# Altium footprint library CD's_LIB_2018.PcbLib: 155 footprints (part 6 of 10)
Each footprint in its own frame and in the unit in brackets; x right, y up, seen from the top. Pads: shape width x height; smd on the part's side, far side on the other; paste and mask are expansions set on the pad; w line width, h text height; cw(c..) or ccw(c..) is an arc to the next point about the centre after c.
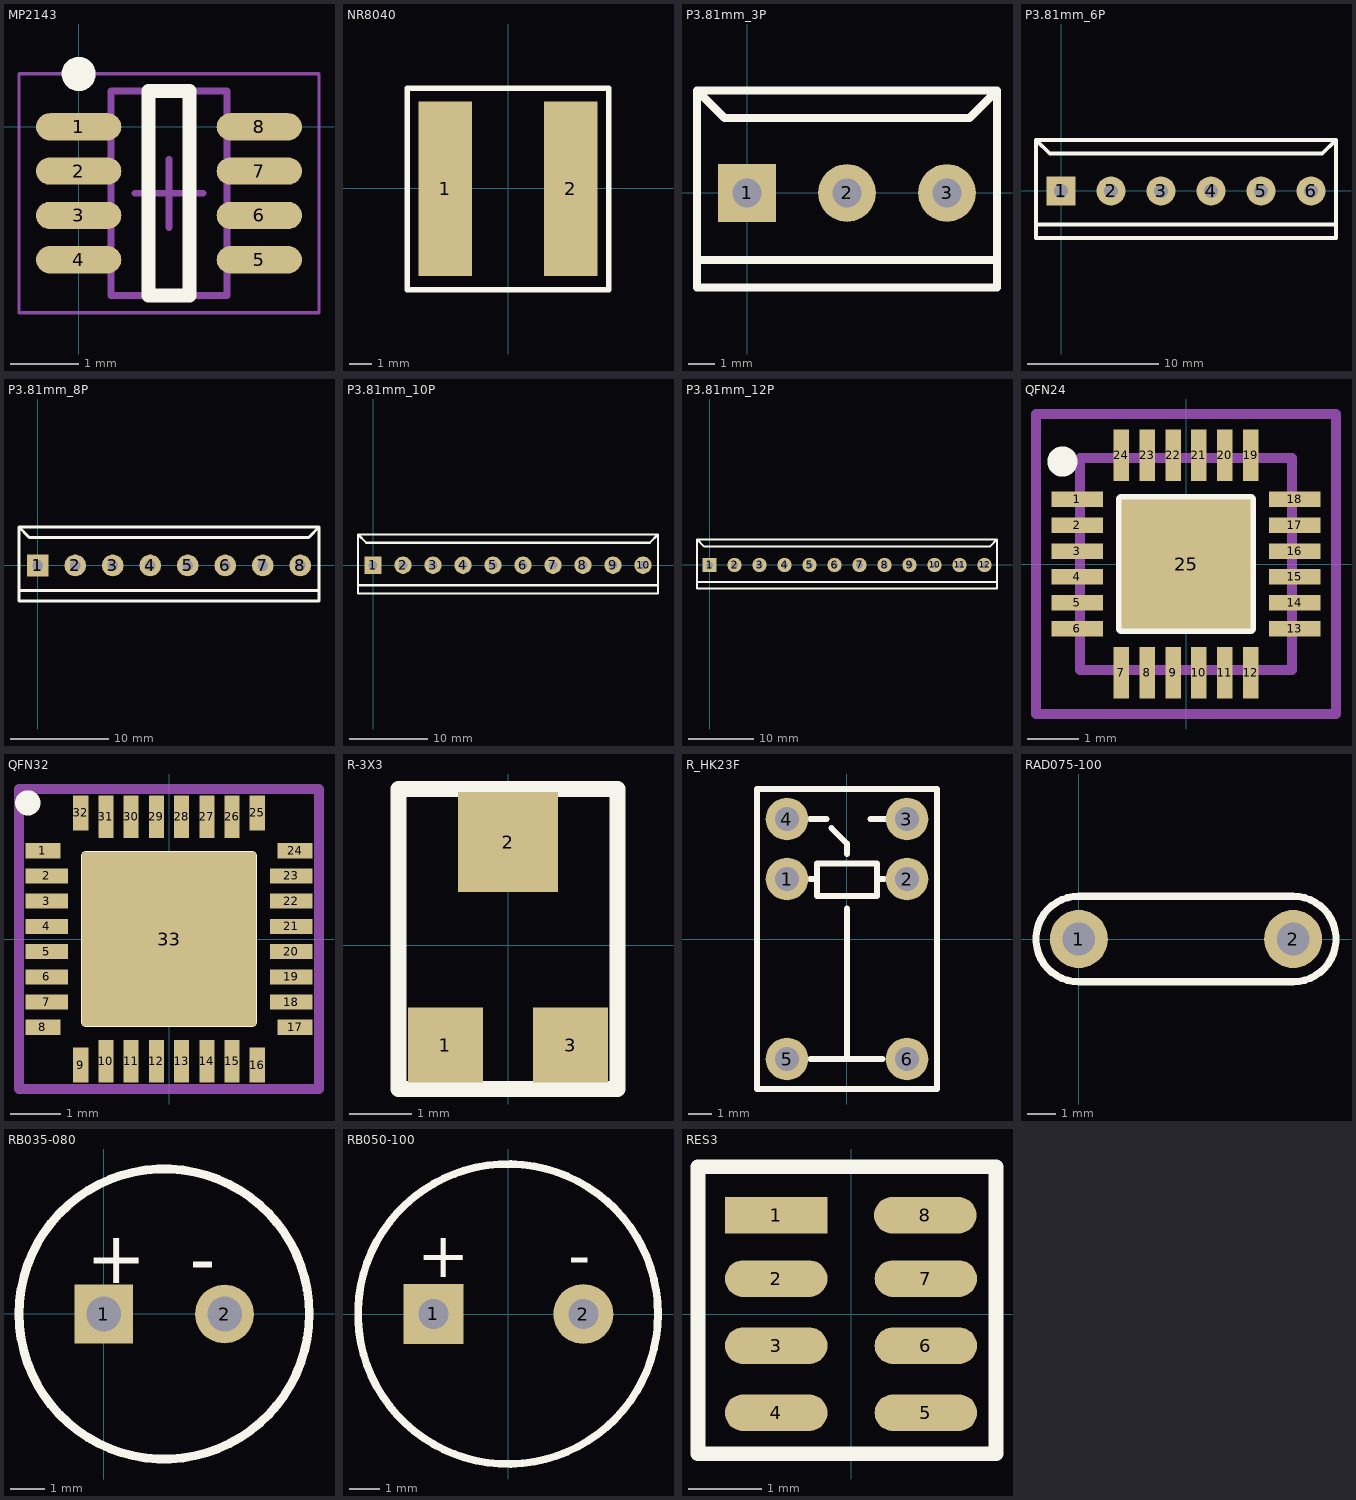
[diagram p5: the footprints below, top view; thin cyan lines are the x and y axes]

## MP2143 [mm] "TSOT23-8"
height 1
pads (8):
  oval 1.25x0.4 smd: 1(0,0) 2(0,-0.65) 3(0,-1.3) 4(0,-1.95) 5(2.65,-1.95) 6(2.65,-1.3) 7(2.65,-0.65) 8(2.65,0)
Top Overlay:
  circle w0.25: c0,0.775 r0.125
  lines w0.2: 1.025,-2.475 1.025,0.525 1.625,0.525 1.625,-2.475 1.025,-2.475
Mechanical 13:
  lines w0.1: 0.475,-2.475 0.475,0.525 2.175,0.525 2.175,-2.475 0.475,-2.475
Mechanical 15:
  lines w0.05: -0.875,-2.725 -0.875,0.775 3.525,0.775 3.525,-2.725 -0.875,-2.725
  lines w0.1: 0.825,-0.975 1.825,-0.975 ; 1.325,-1.475 1.325,-0.475
3D body: height 1, standoff 1, extent 0.475,-2.475 2.175,0.525

## NR8040 [mm]
pads (2):
  rect 2.4x7.8 smd: 1(-2.806,-0.021) 2(2.794,-0.021)
Top Overlay:
  lines w0.254: -4.502,-4.525 4.498,-4.525 4.498,4.475 -4.502,4.475 -4.502,-4.525

## P3.81mm_3P [mm] "3.81接线端子"
pads (3):
  rect 2.2x2.2 hole 1.1: 1(0,0)
  round 2.2 hole 1.1: 2(3.81,0) 3(7.62,0)
Top Overlay:
  lines w0.3: -1.829,-2.559 9.5,-2.559 ; -1.905,3.9 -0.857,2.852 8.477,2.852 9.525,3.9 ; -1.905,3.9 9.525,3.9 ; -1.905,3.9 -1.905,-3.6 9.525,-3.6 9.525,3.9

## P3.81mm_6P [mm] "3.81接线端子"
pads (6):
  rect 2.2x2.2 hole 1.1: 1(0,0)
  round 2.2 hole 1.1: 2(3.81,0) 3(7.62,0) 4(11.43,0) 5(15.24,0) 6(19.05,0)
Top Overlay:
  lines w0.3: -1.829,-2.559 20.955,-2.559 ; -1.905,3.9 -1.905,-3.6 20.955,-3.6 20.955,3.9 ; -1.905,3.9 20.955,3.9 ; -1.905,3.9 -0.857,2.852 19.907,2.852 20.955,3.9

## P3.81mm_8P [mm] "3.81接线端子"
pads (8):
  rect 2.2x2.2 hole 1.1: 1(0,0)
  round 2.2 hole 1.1: 2(3.81,0) 3(7.62,0) 4(11.43,0) 5(15.24,0) 6(19.05,0) 7(22.86,0) 8(26.67,0)
Top Overlay:
  lines w0.3: -1.829,-2.559 28.575,-2.559 ; -1.905,3.9 -0.857,2.852 27.527,2.852 28.575,3.9 ; -1.905,3.9 28.575,3.9 ; -1.905,3.9 -1.905,-3.6 28.575,-3.6 28.575,3.9

## P3.81mm_10P [mm] "3.81接线端子"
pads (10):
  rect 2.2x2.2 hole 1.1: 1(0,0)
  round 2.2 hole 1.1: 2(3.81,0) 3(7.62,0) 4(11.43,0) 5(15.24,0) 6(19.05,0) 7(22.86,0) 8(26.67,0) 9(30.48,0) 10(34.29,0)
Top Overlay:
  lines w0.3: -1.829,-2.559 36.195,-2.559 ; -1.905,3.9 -1.905,-3.6 36.195,-3.6 36.195,3.9 ; -1.905,3.9 36.195,3.9 ; -1.905,3.9 -0.857,2.852 35.147,2.852 36.195,3.9

## P3.81mm_12P [mm] "3.81接线端子"
pads (12):
  rect 2.2x2.2 hole 1.1: 1(0,0)
  round 2.2 hole 1.1: 2(3.81,0) 3(7.62,0) 4(11.43,0) 5(15.24,0) 6(19.05,0) 7(22.86,0) 8(26.67,0) 9(30.48,0) 10(34.29,0) 11(38.1,0) 12(41.91,0)
Top Overlay:
  lines w0.3: -1.829,-2.559 43.815,-2.559 ; -1.905,3.9 -0.857,2.852 42.767,2.852 43.815,3.9 ; -1.905,3.9 43.815,3.9 ; -1.905,3.9 -1.905,-3.6 43.815,-3.6 43.815,3.9

## PCBComponent_1 - duplicate [mm]

## QFN24 [mm]
height 1.27
pads (25):
  rect 1x0.3 smd: 1(-2.1,1.25) 2(-2.1,0.75) 3(-2.1,0.25) 4(-2.1,-0.25) 5(-2.1,-0.75) 6(-2.1,-1.25) 13(2.1,-1.25) 14(2.1,-0.75) 15(2.1,-0.25) 16(2.1,0.25) 17(2.1,0.75) 18(2.1,1.25)
  rect 0.3x1 smd: 7(-1.25,-2.1) 8(-0.75,-2.1) 9(-0.25,-2.1) 10(0.25,-2.1) 11(0.75,-2.1) 12(1.25,-2.1) 19(1.25,2.1) 20(0.75,2.1) 21(0.25,2.1) 22(-0.25,2.1) 23(-0.75,2.1) 24(-1.25,2.1)
  rrect0% 2.5x2.5 smd: 25(0,0)
Top Overlay:
  circle w0.3: c-2.388,1.981 r0.141
  lines w0.2: -1.25,-1.25 -1.25,1.25 1.25,1.25 1.25,-1.25 -1.25,-1.25
Mechanical 1:
  lines w0.2: -2.05,-2.05 -2.05,2.05 2.05,2.05 2.05,-2.05 -2.05,-2.05
Mechanical 16:
  lines w0.2: -0.5,0 0,0 ; 0,-0.5 0,0 ; 0,0.5 0,0 ; 0.5,0 0,0 ; -2.9,-2.9 -2.9,2.9 2.9,2.9 2.9,-2.9 -2.9,-2.9
3D body: height 1, standoff 0, extent -2.159,-2.159 2.159,2.159

## QFN32 [mm]
height 1.27
pads (33):
  rect 0.7x0.3 smd: 1(-2.5,1.75) 8(-2.5,-1.75) 17(2.5,-1.75) 24(2.5,1.75)
  rect 0.85x0.3 smd: 2(-2.425,1.25) 3(-2.425,0.75) 4(-2.425,0.25) 5(-2.425,-0.25) 6(-2.425,-0.75) 7(-2.425,-1.25) 18(2.425,-1.25) 19(2.425,-0.75) 20(2.425,-0.25) 21(2.425,0.25) 22(2.425,0.75) 23(2.425,1.25)
  rect 0.3x0.7 smd: 9(-1.75,-2.5) 16(1.75,-2.5) 25(1.75,2.5) 32(-1.75,2.5)
  rect 0.3x0.85 smd: 10(-1.25,-2.425) 11(-0.75,-2.425) 12(-0.25,-2.425) 13(0.25,-2.425) 14(0.75,-2.425) 15(1.25,-2.425) 26(1.25,2.425) 27(0.75,2.425) 28(0.25,2.425) 29(-0.25,2.425) 30(-0.75,2.425) 31(-1.25,2.425)
  rrect0% 3.45x3.45 smd: 33(0,0)
Top Overlay:
  circle w0.3: c-2.8,2.7 r0.1
  lines w0.2: -1.65,-1.65 1.65,-1.65 1.65,1.65 -1.65,1.65 -1.65,-1.65
Mechanical 16:
  lines w0.2: -0.5,0 0,0 ; 0,-0.5 0,0 ; 0,0.5 0,0 ; 0.5,0 0,0 ; -2.975,-2.975 2.975,-2.975 2.975,2.975 -2.975,2.975 -2.975,-2.975
3D body: height 1, standoff 0, extent -2.575,-2.575 2.575,2.575

## R-3X3 [mm]
pads (3):
  rrect0% 1.2x1.2 smd: 1(-1,-1.6) 3(1,-1.6)
  rrect0% 1.6x1.6 smd: 2(0,1.65)
Top Overlay:
  lines w0.254: -1.75,2.5 -1.75,-2.3 1.75,-2.3 1.75,2.5 -1.7,2.5

## R_HK23F [mm]
pads (6):
  round 1.8 hole 1: 1(-2.54,2.54) 2(2.54,2.54) 3(2.54,5.08) 4(-2.54,5.08) 5(-2.54,-5.08) 6(2.54,-5.08)
Top Overlay:
  lines w0.254: -1.575,2.54 -1.27,2.54 ; -1.575,5.08 -0.864,5.08 ; -1.549,-5.08 1.499,-5.08 ; -0.66,4.699 0,4.039 0,3.607 ; 0,-5.08 0,1.295 ; 0.991,5.08 1.626,5.08 ; 1.27,2.54 1.575,2.54 ; -3.81,-6.35 -3.81,6.35 3.81,6.35 3.81,-6.35 -3.81,-6.35 ; -1.27,1.829 -1.27,3.2 1.27,3.2 1.27,1.829 -1.27,1.829
3D body: height 10.01, standoff -3, extent -3.75,-6.25 3.75,6.25

## RAD075-100 [mil]
pads (2):
  round 80 hole 45: 1(0,0) 2(295.28,0)
Top Overlay:
  lines w10: -0.05,-59.06 cw(c0,0) -0.06,59.06 295.33,59.06 cw(c295.28,0) 295.33,-59.06 -0.05,-59.06
3D body: height 511.81, standoff -98.43, extent -100.7,-136.01 394.69,138.09

## RB035-080 [mm]
pads (2):
  rect 1.7x1.7 hole 1: 1(-0.01,-0.011)
  round 1.7 hole 1: 2(3.49,-0.011)
Top Overlay:
  circle w0.254: c1.74,-0.011 r4.2
  text "-" at 2.482,0.835 h1.52
  text "+" at -0.515,0.886 h1.52
3D body: height 11.73, standoff -3.78, extent -2.294,-4.012 5.749,4.039

## RB050-100 [mm]
pads (2):
  rect 2x2 hole 1: 1(-2.5,0)
  round 2 hole 1: 2(2.5,0)
Top Overlay:
  circle w0.254: c-0.009,0 r5
  text "+" at -3.033,1.219 h1.52
  text "-" at 1.996,1.219 h1.52
3D body: height 10.16, standoff -2.3, extent -5.08,-5.08 5.08,5.08

## RES3 [mil]
pads (8):
  rect 55x19.68 smd: 1(-40.16,53)
  oval 55x19.68 smd: 2(-40.16,19) 3(-40.16,-17) 4(-40.16,-53) 5(40.16,-53) 6(40.16,-17) 7(40.16,19) 8(39.84,53)
Top Overlay:
  lines w8: -82.16,-75 -82.16,79 77.84,79 77.84,-75 -82.16,-75
3D body: height 21.65, standoff 0, extent -31.49,-62.99 31.5,63